# Altium footprint library ref-packages.PCBLIB: 1543 footprints (part 12 of 103)
Each footprint in its own frame and in the unit in brackets; x right, y up, seen from the top. Pads: shape width x height; smd on the part's side, far side on the other; paste and mask are expansions set on the pad; w line width, h text height; cw(c..) or ccw(c..) is an arc to the next point about the centre after c.
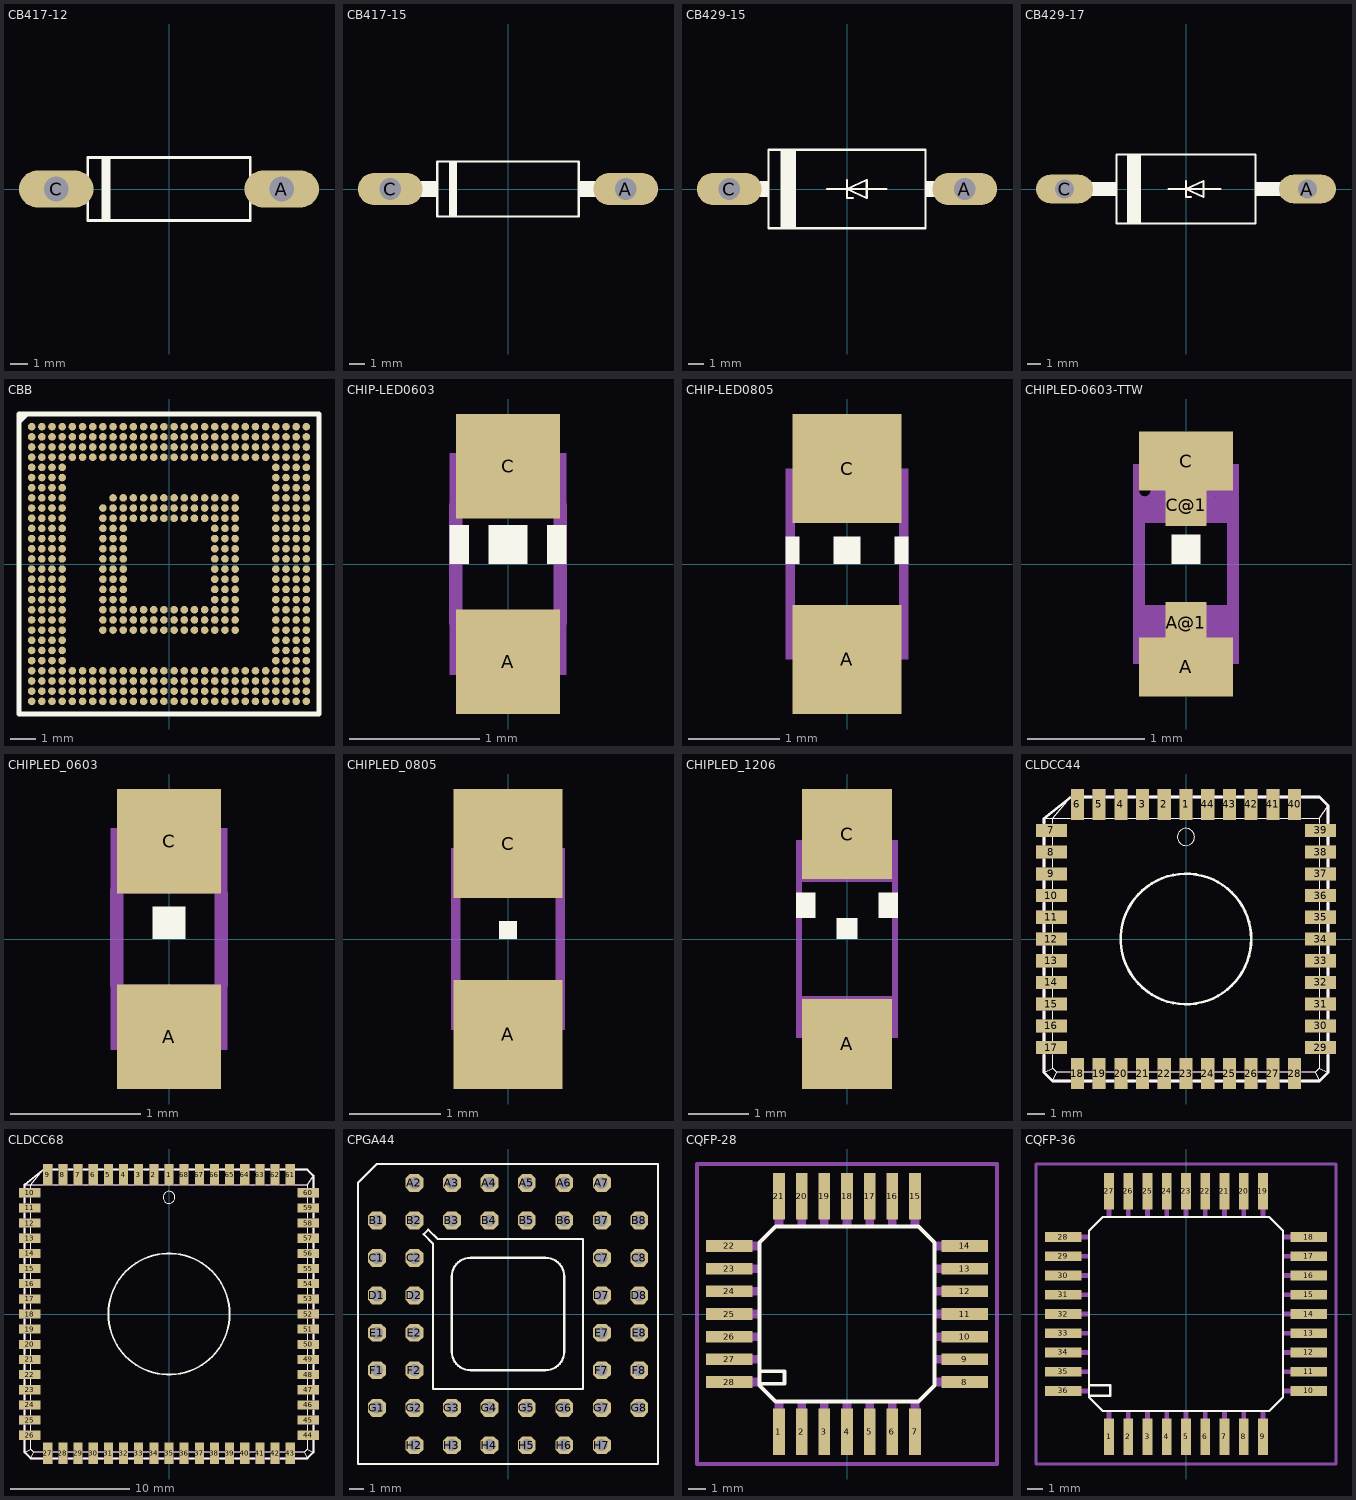
[diagram p11: the footprints below, top view; thin cyan lines are the x and y axes]

## CB417-12 [mil]
pads (2):
  oval 165x82.5 hole 55: A(250,0) C(-250,0)
Top Overlay:
  rectangle: -150,-70 -130,70
  rectangle: 180,-21 195,21
  rectangle: -195,-21 -180,21
  lines w6: -180,-70 -180,70 180,70 180,-70 -180,-70
Mechanical 16:
  lines w44: -250,0 -200,0 ; 200,0 250,0

## CB417-15 [mil]
pads (2):
  oval 165x82.5 hole 55: A(300,0) C(-300,0)
Top Overlay:
  rectangle: -150,-70 -130,70
  rectangle: 180,-21 245,21
  rectangle: -245,-21 -180,21
  lines w6: -180,-70 -180,70 180,70 180,-70 -180,-70
Mechanical 16:
  lines w44: -300,0 -250,0 ; 250,0 300,0

## CB429-15 [mil]
pads (2):
  oval 165x82.5 hole 55: A(300,0) C(-300,0)
Top Overlay:
  rectangle: -170,-100 -130,100
  rectangle: -235,-20 -200,20
  rectangle: 200,-20 235,20
  lines w6: -50,0 0,0 ; 0,23 0,0 ; 15,-23 0,-23 0,0 ; 100,0 0,0 ; 0,0 50,23 50,-23 0,0 ; -200,-100 -200,100 200,100 200,-100 -200,-100
Mechanical 16:
  lines w40: -300,0 -240,0 ; 240,0 300,0

## CB429-17 [mil]
pads (2):
  oval 165x82.5 hole 55: A(350,0) C(-350,0)
Top Overlay:
  rectangle: -170,-100 -130,100
  rectangle: 200,-20 285,20
  rectangle: -285,-20 -200,20
  lines w6: -50,0 0,0 ; 0,23 0,0 ; 15,-23 0,-23 0,0 ; 100,0 0,0 ; 0,0 50,23 50,-23 0,0 ; -200,-100 -200,100 200,100 200,-100 -200,-100
Mechanical 16:
  lines w40: -350,0 -290,0 ; 290,0 350,0

## CBB [mm]
pads (515):
  rrect100% 0.3x0.3 smd: A1(-5.4,5.4) A2(-5,5.4) A3(-4.6,5.4) A4(-4.2,5.4) A5(-3.8,5.4) A6(-3.4,5.4) A7(-3,5.4) A8(-2.6,5.4) A9(-2.2,5.4) A10(-1.8,5.4) A11(-1.4,5.4) A12(-1,5.4) A13(-0.6,5.4) A14(-0.2,5.4) A15(0.2,5.4) A16(0.6,5.4) A17(1,5.4) A18(1.4,5.4) A19(1.8,5.4) A20(2.2,5.4) A21(2.6,5.4) A22(3,5.4) A23(3.4,5.4) A24(3.8,5.4) A25(4.2,5.4) A26(4.6,5.4) A27(5,5.4) A28(5.4,5.4) AA1(-5.4,-2.6) AA2(-5,-2.6) AA3(-4.6,-2.6) AA4(-4.2,-2.6) AA8(-2.6,-2.6) AA9(-2.2,-2.6) AA10(-1.8,-2.6) AA11(-1.4,-2.6) AA12(-1,-2.6) AA13(-0.6,-2.6) AA14(-0.2,-2.6) AA15(0.2,-2.6) AA16(0.6,-2.6) AA17(1,-2.6) AA18(1.4,-2.6) AA19(1.8,-2.6) AA20(2.2,-2.6) AA21(2.6,-2.6) AA25(4.2,-2.6) AA26(4.6,-2.6) AA27(5,-2.6) AA28(5.4,-2.6) AB1(-5.4,-3) AB2(-5,-3) AB3(-4.6,-3) AB4(-4.2,-3) AB25(4.2,-3) AB26(4.6,-3) AB27(5,-3) AB28(5.4,-3) AC1(-5.4,-3.4) AC2(-5,-3.4) AC3(-4.6,-3.4) AC4(-4.2,-3.4) AC25(4.2,-3.4) AC26(4.6,-3.4) AC27(5,-3.4) AC28(5.4,-3.4) AD1(-5.4,-3.8) AD2(-5,-3.8) AD3(-4.6,-3.8) AD4(-4.2,-3.8) AD25(4.2,-3.8) AD26(4.6,-3.8) AD27(5,-3.8) AD28(5.4,-3.8) AE1(-5.4,-4.2) AE2(-5,-4.2) AE3(-4.6,-4.2) AE4(-4.2,-4.2) AE5(-3.8,-4.2) AE6(-3.4,-4.2) AE7(-3,-4.2) AE8(-2.6,-4.2) AE9(-2.2,-4.2) AE10(-1.8,-4.2) AE11(-1.4,-4.2) AE12(-1,-4.2) AE13(-0.6,-4.2) AE14(-0.2,-4.2) AE15(0.2,-4.2) AE16(0.6,-4.2) AE17(1,-4.2) AE18(1.4,-4.2) AE19(1.8,-4.2) AE20(2.2,-4.2) AE21(2.6,-4.2) AE22(3,-4.2) AE23(3.4,-4.2) AE24(3.8,-4.2) AE25(4.2,-4.2) AE26(4.6,-4.2) AE27(5,-4.2) AE28(5.4,-4.2) AF1(-5.4,-4.6) AF2(-5,-4.6) AF3(-4.6,-4.6) AF4(-4.2,-4.6) AF5(-3.8,-4.6) AF6(-3.4,-4.6) AF7(-3,-4.6) AF8(-2.6,-4.6) AF9(-2.2,-4.6) AF10(-1.8,-4.6) AF11(-1.4,-4.6) AF12(-1,-4.6) AF13(-0.6,-4.6) AF14(-0.2,-4.6) AF15(0.2,-4.6) AF16(0.6,-4.6) AF17(1,-4.6) AF18(1.4,-4.6) AF19(1.8,-4.6) AF20(2.2,-4.6) AF21(2.6,-4.6) AF22(3,-4.6) AF23(3.4,-4.6) AF24(3.8,-4.6) AF25(4.2,-4.6) AF26(4.6,-4.6) AF27(5,-4.6) AF28(5.4,-4.6) AG1(-5.4,-5) AG2(-5,-5) AG3(-4.6,-5) AG4(-4.2,-5) AG5(-3.8,-5) AG6(-3.4,-5) AG7(-3,-5) AG8(-2.6,-5) AG9(-2.2,-5) AG10(-1.8,-5) AG11(-1.4,-5) AG12(-1,-5) AG13(-0.6,-5) AG14(-0.2,-5) AG15(0.2,-5) AG16(0.6,-5) AG17(1,-5) AG18(1.4,-5) AG19(1.8,-5) AG20(2.2,-5) AG21(2.6,-5) AG22(3,-5) AG23(3.4,-5) AG24(3.8,-5) AG25(4.2,-5) AG26(4.6,-5) AG27(5,-5) AG28(5.4,-5) AH1(-5.4,-5.4) AH2(-5,-5.4) AH3(-4.6,-5.4) AH4(-4.2,-5.4) AH5(-3.8,-5.4) AH6(-3.4,-5.4) AH7(-3,-5.4) AH8(-2.6,-5.4) AH9(-2.2,-5.4) AH10(-1.8,-5.4) AH11(-1.4,-5.4) AH12(-1,-5.4) AH13(-0.6,-5.4) AH14(-0.2,-5.4) AH15(0.2,-5.4) AH16(0.6,-5.4) AH17(1,-5.4) AH18(1.4,-5.4) AH19(1.8,-5.4) AH20(2.2,-5.4) AH21(2.6,-5.4) AH22(3,-5.4) AH23(3.4,-5.4) AH24(3.8,-5.4) AH25(4.2,-5.4) AH26(4.6,-5.4) AH27(5,-5.4) AH28(5.4,-5.4) B1(-5.4,5) B2(-5,5) B3(-4.6,5) B4(-4.2,5) B5(-3.8,5) B6(-3.4,5) B7(-3,5) B8(-2.6,5) B9(-2.2,5) B10(-1.8,5) B11(-1.4,5) B12(-1,5) B13(-0.6,5) B14(-0.2,5) B15(0.2,5) B16(0.6,5) B17(1,5) B18(1.4,5) B19(1.8,5) B20(2.2,5) B21(2.6,5) B22(3,5) B23(3.4,5) B24(3.8,5) B25(4.2,5) B26(4.6,5) B27(5,5) B28(5.4,5) C1(-5.4,4.6) C2(-5,4.6) C3(-4.6,4.6) C4(-4.2,4.6) C5(-3.8,4.6) C6(-3.4,4.6) C7(-3,4.6) C8(-2.6,4.6) C9(-2.2,4.6) C10(-1.8,4.6) C11(-1.4,4.6) C12(-1,4.6) C13(-0.6,4.6) C14(-0.2,4.6) C15(0.2,4.6) C16(0.6,4.6) C17(1,4.6) C18(1.4,4.6) C19(1.8,4.6) C20(2.2,4.6) C21(2.6,4.6) C22(3,4.6) C23(3.4,4.6) C24(3.8,4.6) C25(4.2,4.6) C26(4.6,4.6) C27(5,4.6) C28(5.4,4.6) D1(-5.4,4.2) D2(-5,4.2) D3(-4.6,4.2) D4(-4.2,4.2) D5(-3.8,4.2) D6(-3.4,4.2) D7(-3,4.2) D8(-2.6,4.2) D9(-2.2,4.2) D10(-1.8,4.2) D11(-1.4,4.2) D12(-1,4.2) D13(-0.6,4.2) D14(-0.2,4.2) D15(0.2,4.2) D16(0.6,4.2) D17(1,4.2) D18(1.4,4.2) D19(1.8,4.2) D20(2.2,4.2) D21(2.6,4.2) D22(3,4.2) D23(3.4,4.2) D24(3.8,4.2) D25(4.2,4.2) D26(4.6,4.2) D27(5,4.2) D28(5.4,4.2) E1(-5.4,3.8) E2(-5,3.8) E3(-4.6,3.8) E4(-4.2,3.8) E25(4.2,3.8) E26(4.6,3.8) E27(5,3.8) E28(5.4,3.8) F1(-5.4,3.4) F2(-5,3.4) F3(-4.6,3.4) F4(-4.2,3.4) F25(4.2,3.4) F26(4.6,3.4) F27(5,3.4) F28(5.4,3.4) G1(-5.4,3) G2(-5,3) G3(-4.6,3) G4(-4.2,3) G25(4.2,3) G26(4.6,3) G27(5,3) G28(5.4,3) H1(-5.4,2.6) H2(-5,2.6) H3(-4.6,2.6) H4(-4.2,2.6) H9(-2.2,2.6) H10(-1.8,2.6) H11(-1.4,2.6) H12(-1,2.6) H13(-0.6,2.6) H14(-0.2,2.6) H15(0.2,2.6) H16(0.6,2.6) H17(1,2.6) H18(1.4,2.6) H19(1.8,2.6) H20(2.2,2.6) H21(2.6,2.6) H25(4.2,2.6) H26(4.6,2.6) H27(5,2.6) H28(5.4,2.6) J1(-5.4,2.2) J2(-5,2.2) J3(-4.6,2.2) J4(-4.2,2.2) J8(-2.6,2.2) J9(-2.2,2.2) J10(-1.8,2.2) J11(-1.4,2.2) J12(-1,2.2) J13(-0.6,2.2) J14(-0.2,2.2) J15(0.2,2.2) J16(0.6,2.2) J17(1,2.2) J18(1.4,2.2) J19(1.8,2.2) J20(2.2,2.2) J21(2.6,2.2) J25(4.2,2.2) J26(4.6,2.2) J27(5,2.2) J28(5.4,2.2) K1(-5.4,1.8) K2(-5,1.8) K3(-4.6,1.8) K4(-4.2,1.8) K8(-2.6,1.8) K9(-2.2,1.8) K10(-1.8,1.8) K11(-1.4,1.8) K12(-1,1.8) K13(-0.6,1.8) K14(-0.2,1.8) K15(0.2,1.8) K16(0.6,1.8) K17(1,1.8) K18(1.4,1.8) K19(1.8,1.8) K20(2.2,1.8) K21(2.6,1.8) K25(4.2,1.8) K26(4.6,1.8) K27(5,1.8) K28(5.4,1.8) L1(-5.4,1.4) L2(-5,1.4) L3(-4.6,1.4) L4(-4.2,1.4) L8(-2.6,1.4) L9(-2.2,1.4) L10(-1.8,1.4) L19(1.8,1.4) L20(2.2,1.4) L21(2.6,1.4) L25(4.2,1.4) L26(4.6,1.4) L27(5,1.4) L28(5.4,1.4) M1(-5.4,1) M2(-5,1) M3(-4.6,1) M4(-4.2,1) M8(-2.6,1) M9(-2.2,1) M10(-1.8,1) M19(1.8,1) M20(2.2,1) M21(2.6,1) M25(4.2,1) M26(4.6,1) M27(5,1) M28(5.4,1) N1(-5.4,0.6) N2(-5,0.6) N3(-4.6,0.6) N4(-4.2,0.6) N8(-2.6,0.6) N9(-2.2,0.6) N10(-1.8,0.6) N19(1.8,0.6) N20(2.2,0.6) N21(2.6,0.6) N25(4.2,0.6) N26(4.6,0.6) N27(5,0.6) N28(5.4,0.6) P1(-5.4,0.2) P2(-5,0.2) P3(-4.6,0.2) P4(-4.2,0.2) P8(-2.6,0.2) P9(-2.2,0.2) P10(-1.8,0.2) P19(1.8,0.2) P20(2.2,0.2) P21(2.6,0.2) P25(4.2,0.2) P26(4.6,0.2) P27(5,0.2) P28(5.4,0.2) R1(-5.4,-0.2) R2(-5,-0.2) R3(-4.6,-0.2) R4(-4.2,-0.2) R8(-2.6,-0.2) R9(-2.2,-0.2) R10(-1.8,-0.2) R19(1.8,-0.2) R20(2.2,-0.2) R21(2.6,-0.2) R25(4.2,-0.2) R26(4.6,-0.2) R27(5,-0.2) R28(5.4,-0.2) T1(-5.4,-0.6) T2(-5,-0.6) T3(-4.6,-0.6) T4(-4.2,-0.6) T8(-2.6,-0.6) T9(-2.2,-0.6) T10(-1.8,-0.6) T19(1.8,-0.6) T20(2.2,-0.6) T21(2.6,-0.6) T25(4.2,-0.6) T26(4.6,-0.6) T27(5,-0.6) T28(5.4,-0.6) U1(-5.4,-1) U2(-5,-1) U3(-4.6,-1) U4(-4.2,-1) U8(-2.6,-1) U9(-2.2,-1) U10(-1.8,-1) U19(1.8,-1) U20(2.2,-1) U21(2.6,-1) U25(4.2,-1) U26(4.6,-1) U27(5,-1) U28(5.4,-1) V1(-5.4,-1.4) V2(-5,-1.4) V3(-4.6,-1.4) V4(-4.2,-1.4) V8(-2.6,-1.4) V9(-2.2,-1.4) V10(-1.8,-1.4) V19(1.8,-1.4) V20(2.2,-1.4) V21(2.6,-1.4) V25(4.2,-1.4) V26(4.6,-1.4) V27(5,-1.4) V28(5.4,-1.4) W1(-5.4,-1.8) W2(-5,-1.8) W3(-4.6,-1.8) W4(-4.2,-1.8) W8(-2.6,-1.8) W9(-2.2,-1.8) W10(-1.8,-1.8) W11(-1.4,-1.8) W12(-1,-1.8) W13(-0.6,-1.8) W14(-0.2,-1.8) W15(0.2,-1.8) W16(0.6,-1.8) W17(1,-1.8) W18(1.4,-1.8) W19(1.8,-1.8) W20(2.2,-1.8) W21(2.6,-1.8) W25(4.2,-1.8) W26(4.6,-1.8) W27(5,-1.8) W28(5.4,-1.8) Y1(-5.4,-2.2) Y2(-5,-2.2) Y3(-4.6,-2.2) Y4(-4.2,-2.2) Y8(-2.6,-2.2) Y9(-2.2,-2.2) Y10(-1.8,-2.2) Y11(-1.4,-2.2) Y12(-1,-2.2) Y13(-0.6,-2.2) Y14(-0.2,-2.2) Y15(0.2,-2.2) Y16(0.6,-2.2) Y17(1,-2.2) Y18(1.4,-2.2) Y19(1.8,-2.2) Y20(2.2,-2.2) Y21(2.6,-2.2) Y25(4.2,-2.2) Y26(4.6,-2.2) Y27(5,-2.2) Y28(5.4,-2.2)
Top Overlay:
  lines w0.203: -5.898,5.6 -5.898,5.898 -5.6,5.898 ; -5.898,5.6 -5.898,-5.898 5.898,-5.898 5.898,5.898 -5.6,5.898 ; -5.898,5.6 -5.6,5.898
Top Solder:
  drawing of 515 lines, arcs and shapes, not listed

## CHIP-LED0603 [mil]
pads (2):
  rect 31.5x31.5 smd: A(0,-29.53) C(0,29.53)
Top Overlay:
  rectangle: -17.72,0 -11.81,11.81
  rectangle: 11.81,0 17.72,11.81
  rectangle: -5.91,0 5.91,11.81
Mechanical 16:
  rectangle: -17.72,17.72 17.72,33.46
  rectangle: -17.72,-33.46 17.72,-17.72
  lines w4: -15.75,-17.72 -15.75,17.72 ; 15.75,-17.72 15.75,17.72

## CHIP-LED0805 [mil]
pads (2):
  rect 47.24x47.24 smd: A(0,-41.34) C(0,41.34)
Top Overlay:
  rectangle: -26.57,0 -20.67,11.81
  rectangle: 20.67,0 26.57,11.81
  rectangle: -5.91,0 5.91,11.81
Mechanical 16:
  rectangle: -26.57,17.72 26.57,41.34
  rectangle: -26.57,-41.34 26.57,-17.72
  lines w4: -24.61,-17.72 -24.61,17.72 ; 24.61,-18.7 24.61,17.72

## CHIPLED-0603-TTW [mm]
pads (4):
  rect 0.8x0.5 smd: A(0,-0.875) C(0,0.875)
  rect 0.35x0.35 smd: A@1(0,-0.5) C@1(0,0.5)
Top Overlay:
  rectangle: -0.125,0 0.125,0.25
Top Solder:
  rectangle: -0.175,0.325 0.175,0.7
  rectangle: -0.4,0.625 0.4,1.125
  rectangle: -0.4,-1.125 0.4,-0.625
  rectangle: -0.175,-0.675 0.175,-0.325
Mechanical 16:
  circle w0.051: c-0.35,0.625 r0.075
  rectangle: -0.45,0.7 -0.25,0.85
  rectangle: -0.275,0.55 -0.225,0.6
  rectangle: -0.45,0.35 -0.4,0.725
  rectangle: 0.25,0.55 0.45,0.85
  rectangle: -0.45,0.35 0.45,0.575
  rectangle: -0.45,-0.85 -0.25,-0.35
  rectangle: 0.25,-0.85 0.45,-0.35
  rectangle: -0.275,-0.575 0.275,-0.35
  rectangle: -0.275,-0.65 -0.175,-0.55
  rectangle: 0.175,-0.65 0.275,-0.55
  lines w0.051: -0.275,-0.825 cw(c0,-0.825) 0.275,-0.825
  lines w0.102: -0.4,-0.35 -0.4,0.375 ; -0.3,0.8 ccw(c0,0.826) 0.3,0.8 ; 0.4,-0.35 0.4,0.35

## CHIPLED_0603 [mil]
pads (2):
  rect 31.5x31.5 smd: A(0,-29.53) C(0,29.53)
Top Overlay:
  rectangle: -4.92,0 4.92,9.84
Mechanical 16:
  circle w2: c-13.78,24.61 r2.95
  rectangle: -17.72,27.56 -9.84,33.46
  rectangle: -10.83,21.65 -8.86,23.62
  rectangle: -17.72,13.78 -15.75,28.54
  rectangle: 9.84,21.65 17.72,33.46
  rectangle: -17.72,13.78 17.72,22.64
  rectangle: -17.72,-33.46 -9.84,-13.78
  rectangle: 9.84,-33.46 17.72,-13.78
  rectangle: -10.83,-22.64 10.83,-13.78
  rectangle: -10.83,-25.59 -6.89,-21.65
  rectangle: 6.89,-25.59 10.83,-21.65
  lines w2: -10.83,-32.48 cw(c0,-32.48) 10.83,-32.48
  lines w4: -15.75,-13.78 -15.75,14.76 ; -11.81,31.5 ccw(c0,32.53) 11.81,31.5 ; 15.75,-13.78 15.75,13.78

## CHIPLED_0805 [mil]
pads (2):
  rect 47.24x47.24 smd: A(0,-41.34) C(0,41.34)
Top Overlay:
  rectangle: -3.94,0 3.94,7.87
Mechanical 16:
  circle w4: c-17.72,33.46 r4.06
  rectangle: 11.81,19.69 24.61,39.37
  rectangle: -12.8,19.69 -6.89,29.53
  rectangle: 6.89,19.69 12.8,29.53
  rectangle: -7.87,19.69 7.87,26.57
  rectangle: 11.81,-39.37 24.61,-19.69
  rectangle: -24.61,-39.37 -11.81,-19.69
  rectangle: 6.89,-29.53 12.8,-19.69
  rectangle: -12.8,-29.53 -6.89,-19.69
  rectangle: -7.87,-26.57 7.87,-19.69
  rectangle: -23.62,19.69 -11.81,31.5
  rectangle: -24.61,36.42 -13.78,39.37
  lines w4: -22.64,-19.69 -22.64,36.42 ; -13.78,-37.4 cw(c0,-38.42) 13.78,-37.4 ; -13.78,37.4 ccw(c0,38.42) 13.78,37.4 ; 22.64,-20.67 22.64,20.67

## CHIPLED_1206 [mil]
pads (2):
  rect 59.06x59.06 smd: A(0,-68.9) C(0,68.9)
Top Overlay:
  rectangle: -33.46,13.78 -20.67,30.51
  rectangle: 20.67,13.78 33.46,30.51
  rectangle: -6.89,0 6.89,13.78
Mechanical 16:
  circle w4: c-21.65,56.1 r3.94
  rectangle: -33.46,60.04 -13.78,64.96
  rectangle: -33.46,48.23 -24.61,61.02
  rectangle: -17.72,48.23 -12.8,57.09
  rectangle: -25.59,48.23 -8.86,53.15
  rectangle: 13.78,51.18 33.46,64.96
  rectangle: 9.84,48.23 33.46,53.15
  rectangle: -33.46,37.4 33.46,49.21
  rectangle: -33.46,-64.96 33.46,-37.4
  lines w4: -31.5,-37.4 -31.5,37.4 ; -15.75,62.99 ccw(c0,64.01) 15.75,62.99 ; 31.5,-37.4 31.5,37.4

## CLDCC44 [mil]
pads (44):
  rect 29.92x70.87 smd: 1(0,309.45) 2(-50,309.45) 3(-100,309.45) 4(-150,309.45) 5(-200,309.45) 6(-250,309.45) 18(-250,-309.45) 19(-200,-309.45) 20(-150,-309.45) 21(-100,-309.45) 22(-50,-309.45) 23(0,-309.45) 24(50,-309.45) 25(100,-309.45) 26(150,-309.45) 27(200,-309.45) 28(250,-309.45) 40(250,309.45) 41(200,309.45) 42(150,309.45) 43(100,309.45) 44(50,309.45)
  rect 70.87x29.92 smd: 7(-309.45,250) 8(-309.45,200) 9(-309.45,150) 10(-309.45,100) 11(-309.45,50) 12(-309.45,0) 13(-309.45,-50) 14(-309.45,-100) 15(-309.45,-150) 16(-309.45,-200) 17(-309.45,-250) 29(309.45,-250) 30(309.45,-200) 31(309.45,-150) 32(309.45,-100) 33(309.45,-50) 34(309.45,0) 35(309.45,50) 36(309.45,100) 37(309.45,150) 38(309.45,200) 39(309.45,250)
Top Overlay:
  circle w2: c0,234.65 r19.69
  circle w6: c0,0 r150
  lines w2: -326.38,-306.69 -306.69,-296.85 ; -326.38,277.17 -306.69,277.17 ; -306.69,-326.38 -296.85,-306.69 ; -306.69,-265.75 -306.69,-296.85 ; -306.69,-234.25 -306.69,-215.75 ; -306.69,-184.25 -306.69,-165.75 ; -306.69,-134.25 -306.69,-115.75 ; -306.69,-84.25 -306.69,-65.75 ; -306.69,-34.25 -306.69,-15.75 ; -306.69,15.75 -306.69,34.25 ; -306.69,65.75 -306.69,84.25 ; -306.69,115.75 -306.69,134.25 ; -306.69,165.75 -306.69,184.25 ; -306.69,215.75 -306.69,234.25 ; -306.69,265.75 -306.69,277.17 ; -265.75,-306.69 -296.85,-306.69 ; -265.75,277.17 -306.69,277.17 ; -265.75,325.59 -306.69,277.17 ; -234.25,-306.69 -215.75,-306.69 ; -234.25,277.17 -215.75,277.17 ; -184.25,-306.69 -165.75,-306.69 ; -184.25,277.17 -165.75,277.17 ; -134.25,-306.69 -115.75,-306.69 ; -134.25,277.17 -115.75,277.17 ; -84.25,-306.69 -65.75,-306.69 ; -84.25,277.17 -65.75,277.17 ; -34.25,-306.69 -15.75,-306.69 ; -34.25,277.17 -15.75,277.17 ; 15.75,-306.69 34.25,-306.69 ; 15.75,277.17 34.25,277.17 ; 65.75,-306.69 84.25,-306.69 ; 65.75,277.17 84.25,277.17 ; 115.75,-306.69 134.25,-306.69 ; 115.75,277.17 134.25,277.17 ; 165.75,-306.69 184.25,-306.69 ; 165.75,277.17 184.25,277.17 ; 215.75,-306.69 234.25,-306.69 ; 215.75,277.17 234.25,277.17 ; 265.75,-306.69 296.85,-306.69 ; 265.75,277.17 306.69,277.17 ; 306.69,-326.38 296.85,-306.69 ; 306.69,-265.75 306.69,-296.85 ; 306.69,-234.25 306.69,-215.75 ; 306.69,-184.25 306.69,-165.75 ; 306.69,-134.25 306.69,-115.75 ; 306.69,-84.25 306.69,-65.75 ; 306.69,-34.25 306.69,-15.75 ; 306.69,15.75 306.69,34.25 ; 306.69,65.75 306.69,84.25 ; 306.69,115.75 306.69,134.25 ; 306.69,165.75 306.69,184.25 ; 306.69,215.75 306.69,234.25 ; 306.69,265.75 306.69,277.17 ; 326.38,-306.69 306.69,-296.85 ; 326.38,306.69 306.69,277.17 ; -306.69,-296.85 -296.85,-306.69 ; 296.85,-306.69 306.69,-296.85
  lines w6: -326.38,-267.32 -326.38,-306.69 -306.69,-326.38 -267.32,-326.38 ; -326.38,-232.68 -326.38,-217.32 ; -326.38,-182.68 -326.38,-167.32 ; -326.38,-132.68 -326.38,-117.32 ; -326.38,-82.68 -326.38,-67.32 ; -326.38,-32.68 -326.38,-17.32 ; -326.38,17.32 -326.38,32.68 ; -326.38,67.32 -326.38,82.68 ; -326.38,117.32 -326.38,132.68 ; -326.38,167.32 -326.38,182.68 ; -326.38,217.32 -326.38,232.68 ; -326.38,267.32 -326.38,277.17 -267.32,324.41 ; -232.68,-326.38 -217.32,-326.38 ; -232.68,326.38 -217.32,326.38 ; -182.68,-326.38 -167.32,-326.38 ; -182.68,326.38 -167.32,326.38 ; -132.68,-326.38 -117.32,-326.38 ; -132.68,326.38 -117.32,326.38 ; -82.68,-326.38 -67.32,-326.38 ; -82.68,326.38 -67.32,326.38 ; -32.68,-326.38 -17.32,-326.38 ; -32.68,326.38 -17.32,326.38 ; 17.32,-326.38 32.68,-326.38 ; 17.32,326.38 32.68,326.38 ; 67.32,-326.38 82.68,-326.38 ; 67.32,326.38 82.68,326.38 ; 117.32,-326.38 132.68,-326.38 ; 117.32,326.38 132.68,326.38 ; 167.32,-326.38 182.68,-326.38 ; 167.32,326.38 182.68,326.38 ; 217.32,-326.38 232.68,-326.38 ; 217.32,326.38 232.68,326.38 ; 267.32,-326.38 306.69,-326.38 326.38,-306.69 326.38,-267.32 ; 267.32,326.38 306.69,326.38 326.38,306.69 326.38,267.32 ; 326.38,-232.68 326.38,-217.32 ; 326.38,-182.68 326.38,-167.32 ; 326.38,-132.68 326.38,-117.32 ; 326.38,-82.68 326.38,-67.32 ; 326.38,-32.68 326.38,-17.32 ; 326.38,17.32 326.38,32.68 ; 326.38,67.32 326.38,82.68 ; 326.38,117.32 326.38,132.68 ; 326.38,167.32 326.38,182.68 ; 326.38,217.32 326.38,232.68
Mechanical 16:
  rectangle: 326.38,85.04 344.88,114.96
  rectangle: 326.38,35.04 344.88,64.96
  rectangle: 326.38,-14.96 344.88,14.96
  rectangle: 326.38,-64.96 344.88,-35.04
  rectangle: 326.38,-114.96 344.88,-85.04
  rectangle: 326.38,-164.96 344.88,-135.04
  rectangle: 326.38,-214.96 344.88,-185.04
  rectangle: 135.04,-344.88 164.96,-326.38
  rectangle: 85.04,-344.88 114.96,-326.38
  rectangle: 35.04,-344.88 64.96,-326.38
  rectangle: -14.96,-344.88 14.96,-326.38
  rectangle: -64.96,-344.88 -35.04,-326.38
  rectangle: -114.96,-344.88 -85.04,-326.38
  rectangle: -264.96,-344.88 -235.04,-326.38
  rectangle: -344.88,185.04 -326.38,214.96
  rectangle: -344.88,135.04 -326.38,164.96
  rectangle: -344.88,85.04 -326.38,114.96
  rectangle: -344.88,35.04 -326.38,64.96
  rectangle: -344.88,-14.96 -326.38,14.96
  rectangle: -344.88,-64.96 -326.38,-35.04
  rectangle: -344.88,-114.96 -326.38,-85.04
  rectangle: 135.04,326.38 164.96,344.88
  rectangle: 85.04,326.38 114.96,344.88
  rectangle: 35.04,326.38 64.96,344.88
  rectangle: -14.96,326.38 14.96,344.88
  rectangle: -64.96,326.38 -35.04,344.88
  rectangle: -114.96,326.38 -85.04,344.88
  rectangle: -264.96,326.38 -235.04,344.88
  rectangle: 326.38,135.04 344.88,164.96
  rectangle: 326.38,185.04 344.88,214.96
  rectangle: -344.88,-164.96 -326.38,-135.04
  rectangle: -344.88,-214.96 -326.38,-185.04
  rectangle: 185.04,326.38 214.96,344.88
  rectangle: 235.04,326.38 264.96,344.88
  rectangle: -164.96,326.38 -135.04,344.88
  rectangle: -214.96,326.38 -185.04,344.88
  rectangle: -344.88,-264.96 -326.38,-235.04
  rectangle: -214.96,-344.88 -185.04,-326.38
  rectangle: -164.96,-344.88 -135.04,-326.38
  rectangle: 185.04,-344.88 214.96,-326.38
  rectangle: 235.04,-344.88 264.96,-326.38
  rectangle: 326.38,-264.96 344.88,-235.04
  rectangle: 326.38,235.04 344.88,264.96
  rectangle: -344.88,235.04 -326.38,264.96
  lines w2: -326.38,-306.69 -306.69,-296.85 ; -326.38,277.17 -306.69,277.17 ; -306.69,-326.38 -296.85,-306.69 ; -264.96,326.38 -306.69,277.17 ; 306.69,-326.38 296.85,-306.69 ; 326.38,-306.69 306.69,-296.85 ; 326.38,306.69 306.69,277.17 ; -306.69,-296.85 -296.85,-306.69 ; -306.69,-296.85 -306.69,277.17 ; -306.69,277.17 306.69,277.17 ; -296.85,-306.69 296.85,-306.69 ; 296.85,-306.69 306.69,-296.85 ; 306.69,-296.85 306.69,277.17
  lines w6: -326.38,-306.69 -306.69,-326.38 306.69,-326.38 326.38,-306.69 326.38,306.69 306.69,326.38 -264.96,326.38 -326.38,277.17 -326.38,-306.69

## CLDCC68 [mil]
pads (68):
  rect 29.92x70.87 smd: 1(0,459.45) 2(-50,459.45) 3(-100,459.45) 4(-150,459.45) 5(-200,459.45) 6(-250,459.45) 7(-300,459.45) 8(-350,459.45) 9(-400,459.45) 27(-400,-459.45) 28(-350,-459.45) 29(-300,-459.45) 30(-250,-459.45) 31(-200,-459.45) 32(-150,-459.45) 33(-100,-459.45) 34(-50,-459.45) 35(0,-459.45) 36(50,-459.45) 37(100,-459.45) 38(150,-459.45) 39(200,-459.45) 40(250,-459.45) 41(300,-459.45) 42(350,-459.45) 43(400,-459.45) 61(400,459.45) 62(350,459.45) 63(300,459.45) 64(250,459.45) 65(200,459.45) 66(150,459.45) 67(100,459.45) 68(50,459.45)
  rect 70.87x29.92 smd: 10(-459.45,400) 11(-459.45,350) 12(-459.45,300) 13(-459.45,250) 14(-459.45,200) 15(-459.45,150) 16(-459.45,100) 17(-459.45,50) 18(-459.45,0) 19(-459.45,-50) 20(-459.45,-100) 21(-459.45,-150) 22(-459.45,-200) 23(-459.45,-250) 24(-459.45,-300) 25(-459.45,-350) 26(-459.45,-400) 44(459.45,-400) 45(459.45,-350) 46(459.45,-300) 47(459.45,-250) 48(459.45,-200) 49(459.45,-150) 50(459.45,-100) 51(459.45,-50) 52(459.45,0) 53(459.45,50) 54(459.45,100) 55(459.45,150) 56(459.45,200) 57(459.45,250) 58(459.45,300) 59(459.45,350) 60(459.45,400)
Top Overlay:
  drawing of 158 lines, arcs and shapes, not listed
Mechanical 16:
  rectangle: 476.38,85.04 494.88,114.96
  rectangle: 476.38,35.04 494.88,64.96
  rectangle: 476.38,-14.96 494.88,14.96
  rectangle: 476.38,-64.96 494.88,-35.04
  rectangle: 476.38,-114.96 494.88,-85.04
  rectangle: 476.38,-164.96 494.88,-135.04
  rectangle: 476.38,-214.96 494.88,-185.04
  rectangle: 135.04,-494.88 164.96,-476.38
  rectangle: 85.04,-494.88 114.96,-476.38
  rectangle: 35.04,-494.88 64.96,-476.38
  rectangle: -14.96,-494.88 14.96,-476.38
  rectangle: -64.96,-494.88 -35.04,-476.38
  rectangle: -114.96,-494.88 -85.04,-476.38
  rectangle: -414.96,-494.88 -385.04,-476.38
  rectangle: -494.88,185.04 -476.38,214.96
  rectangle: -494.88,135.04 -476.38,164.96
  rectangle: -494.88,85.04 -476.38,114.96
  rectangle: -494.88,35.04 -476.38,64.96
  rectangle: -494.88,-14.96 -476.38,14.96
  rectangle: -494.88,-64.96 -476.38,-35.04
  rectangle: -494.88,-114.96 -476.38,-85.04
  rectangle: 135.04,476.38 164.96,494.88
  rectangle: 85.04,476.38 114.96,494.88
  rectangle: 35.04,476.38 64.96,494.88
  rectangle: -14.96,476.38 14.96,494.88
  rectangle: -64.96,476.38 -35.04,494.88
  rectangle: -114.96,476.38 -85.04,494.88
  rectangle: -414.96,476.38 -385.04,494.88
  rectangle: 476.38,135.04 494.88,164.96
  rectangle: 476.38,185.04 494.88,214.96
  rectangle: -494.88,-164.96 -476.38,-135.04
  rectangle: -494.88,-214.96 -476.38,-185.04
  rectangle: 185.04,476.38 214.96,494.88
  rectangle: 235.04,476.38 264.96,494.88
  rectangle: -164.96,476.38 -135.04,494.88
  rectangle: -214.96,476.38 -185.04,494.88
  rectangle: -494.88,-264.96 -476.38,-235.04
  rectangle: -214.96,-494.88 -185.04,-476.38
  rectangle: -164.96,-494.88 -135.04,-476.38
  rectangle: 185.04,-494.88 214.96,-476.38
  rectangle: 235.04,-494.88 264.96,-476.38
  rectangle: 476.38,-264.96 494.88,-235.04
  rectangle: 476.38,235.04 494.88,264.96
  rectangle: -494.88,235.04 -476.38,264.96
  rectangle: -264.96,-494.88 -235.04,-476.38
  rectangle: -314.96,-494.88 -285.04,-476.38
  rectangle: -364.96,-494.88 -335.04,-476.38
  rectangle: -494.88,-314.96 -476.38,-285.04
  rectangle: -494.88,-364.96 -476.38,-335.04
  rectangle: -494.88,-414.96 -476.38,-385.04
  rectangle: -494.88,285.04 -476.38,314.96
  rectangle: -494.88,335.04 -476.38,364.96
  rectangle: -494.88,385.04 -476.38,414.96
  rectangle: -264.96,476.38 -235.04,494.88
  rectangle: -314.96,476.38 -285.04,494.88
  rectangle: -364.96,476.38 -335.04,494.88
  rectangle: 476.38,285.04 494.88,314.96
  rectangle: 476.38,335.04 494.88,364.96
  rectangle: 476.38,385.04 494.88,414.96
  rectangle: 285.04,476.38 314.96,494.88
  rectangle: 335.04,476.38 364.96,494.88
  rectangle: 385.04,476.38 414.96,494.88
  rectangle: 476.38,-314.96 494.88,-285.04
  rectangle: 476.38,-364.96 494.88,-335.04
  rectangle: 476.38,-414.96 494.88,-385.04
  rectangle: 285.04,-494.88 314.96,-476.38
  rectangle: 335.04,-494.88 364.96,-476.38
  rectangle: 385.04,-494.88 414.96,-476.38
  lines w2: -476.38,-456.69 -456.69,-446.85 ; -476.38,427.17 -456.69,427.17 ; -456.69,-476.38 -446.85,-456.69 ; -414.96,476.38 -456.69,427.17 ; 456.69,-476.38 446.85,-456.69 ; 476.38,-456.69 456.69,-446.85 ; 476.38,456.69 456.69,427.17 ; -456.69,-446.85 -446.85,-456.69 ; -456.69,-446.85 -456.69,427.17 ; -456.69,427.17 456.69,427.17 ; -446.85,-456.69 446.85,-456.69 ; 446.85,-456.69 456.69,-446.85 ; 456.69,-446.85 456.69,427.17
  lines w6: -476.38,-456.69 -456.69,-476.38 456.69,-476.38 476.38,-456.69 476.38,456.69 456.69,476.38 -414.96,476.38 -476.38,427.17 -476.38,-456.69

## CPGA44 [mil]
pads (44):
  oct 48x48 hole 32: A2(-250,350) A3(-150,350) A4(-50,350) A5(50,350) A6(150,350) A7(250,350) B1(-350,250) B2(-250,250) B3(-150,250) B4(-50,250) B5(50,250) B6(150,250) B7(250,250) B8(350,250) C1(-350,150) C2(-250,150) C7(250,150) C8(350,150) D1(-350,50) D2(-250,50) D7(250,50) D8(350,50) E1(-350,-50) E2(-250,-50) E7(250,-50) E8(350,-50) F1(-350,-150) F2(-250,-150) F7(250,-150) F8(350,-150) G1(-350,-250) G2(-250,-250) G3(-150,-250) G4(-50,-250) G5(50,-250) G6(150,-250) G7(250,-250) G8(350,-250) H2(-250,-350) H3(-150,-350) H4(-50,-350) H5(50,-350) H6(150,-350) H7(250,-350)
Top Overlay:
  lines w6: -400,-400 -400,350 -350,400 400,400 400,-400 -400,-400 ; -225,212.5 -200,187.5 -200,-200 200,-200 200,200 -187.5,200 -212.5,225 -225,212.5 ; -150,-100 -150,100 cw(c-100,100) -100,150 100,150 cw(c100,100) 150,100 150,-100 cw(c100,-100) 100,-150 -100,-150 cw(c-100,-100) -150,-100

## CQFP-28 [mm]
pads (28):
  rect 0.65x2.6 smd: 1(-3.81,-6.6) 2(-2.54,-6.6) 3(-1.27,-6.6) 4(0,-6.6) 5(1.27,-6.6) 6(2.54,-6.6) 7(3.81,-6.6) 15(3.81,6.6) 16(2.54,6.6) 17(1.27,6.6) 18(0,6.6) 19(-1.27,6.6) 20(-2.54,6.6) 21(-3.81,6.6)
  rect 2.6x0.65 smd: 8(6.6,-3.81) 9(6.6,-2.54) 10(6.6,-1.27) 11(6.6,0) 12(6.6,1.27) 13(6.6,2.54) 14(6.6,3.81) 22(-6.6,3.81) 23(-6.6,2.54) 24(-6.6,1.27) 25(-6.6,0) 26(-6.6,-1.27) 27(-6.6,-2.54) 28(-6.6,-3.81)
Top Overlay:
  lines w0.203: -4.8,-3.2 -3.5,-3.2 -3.5,-3.9 -4.9,-3.9 ; -4.9,-3.9 -4.9,4 -4,4.9 4,4.9 4.9,4 4.9,-4 4,-4.9 -4,-4.9 -4.9,-4 -4.9,-3.9
Mechanical 16:
  rectangle: -4.05,-7.4 -3.57,-4.91
  rectangle: -2.78,-7.4 -2.3,-4.91
  rectangle: -1.51,-7.4 -1.03,-4.91
  rectangle: -0.24,-7.4 0.24,-4.91
  rectangle: 1.03,-7.4 1.51,-4.91
  rectangle: 2.3,-7.4 2.78,-4.91
  rectangle: 3.57,-7.4 4.05,-4.91
  rectangle: 4.91,-4.05 7.4,-3.57
  rectangle: 4.91,-2.78 7.4,-2.3
  rectangle: 4.91,-1.51 7.4,-1.03
  rectangle: 4.91,-0.24 7.4,0.24
  rectangle: 4.91,1.03 7.4,1.51
  rectangle: 4.91,2.3 7.4,2.78
  rectangle: 4.91,3.57 7.4,4.05
  rectangle: 3.57,4.91 4.05,7.4
  rectangle: 2.3,4.91 2.78,7.4
  rectangle: 1.03,4.91 1.51,7.4
  rectangle: -0.24,4.91 0.24,7.4
  rectangle: -1.51,4.91 -1.03,7.4
  rectangle: -2.78,4.91 -2.3,7.4
  rectangle: -4.05,4.91 -3.57,7.4
  rectangle: -7.4,3.57 -4.91,4.05
  rectangle: -7.4,2.3 -4.91,2.78
  rectangle: -7.4,1.03 -4.91,1.51
  rectangle: -7.4,-0.24 -4.91,0.24
  rectangle: -7.4,-1.51 -4.91,-1.03
  rectangle: -7.4,-2.78 -4.91,-2.3
  rectangle: -7.4,-4.05 -4.91,-3.57
Mechanical 27:
  lines w0.2: -8.403,-8.403 8.403,-8.403 8.403,8.403 -8.403,8.403 -8.403,-8.403

## CQFP-36 [mm]
pads (36):
  rect 0.65x2.4 smd: 1(-5.08,-8.1) 2(-3.81,-8.1) 3(-2.54,-8.1) 4(-1.27,-8.1) 5(0,-8.1) 6(1.27,-8.1) 7(2.54,-8.1) 8(3.81,-8.1) 9(5.08,-8.1) 19(5.08,8.1) 20(3.81,8.1) 21(2.54,8.1) 22(1.27,8.1) 23(0,8.1) 24(-1.27,8.1) 25(-2.54,8.1) 26(-3.81,8.1) 27(-5.08,8.1)
  rect 2.4x0.65 smd: 10(8.1,-5.08) 11(8.1,-3.81) 12(8.1,-2.54) 13(8.1,-1.27) 14(8.1,0) 15(8.1,1.27) 16(8.1,2.54) 17(8.1,3.81) 18(8.1,5.08) 28(-8.1,5.08) 29(-8.1,3.81) 30(-8.1,2.54) 31(-8.1,1.27) 32(-8.1,0) 33(-8.1,-1.27) 34(-8.1,-2.54) 35(-8.1,-3.81) 36(-8.1,-5.08)
Top Overlay:
  lines w0.152: -6.3,-4.7 -5,-4.7 -5,-5.4 -6.4,-5.4 ; -6.4,-5.4 -6.4,5.5 -5.5,6.4 5.5,6.4 6.4,5.5 6.4,-5.5 5.5,-6.4 -5.5,-6.4 -6.4,-5.5 -6.4,-5.4
Mechanical 16:
  rectangle: -5.24,-8.9 -4.92,-6.4
  rectangle: -3.97,-8.9 -3.65,-6.4
  rectangle: -2.7,-8.9 -2.38,-6.4
  rectangle: -1.43,-8.9 -1.11,-6.4
  rectangle: -0.16,-8.9 0.16,-6.4
  rectangle: 1.11,-8.9 1.43,-6.4
  rectangle: 2.38,-8.9 2.7,-6.4
  rectangle: 3.65,-8.9 3.97,-6.4
  rectangle: 4.92,-8.9 5.24,-6.4
  rectangle: 6.4,-5.24 8.9,-4.92
  rectangle: 6.4,-3.97 8.9,-3.65
  rectangle: 6.4,-2.7 8.9,-2.38
  rectangle: 6.4,-1.43 8.9,-1.11
  rectangle: 6.4,-0.16 8.9,0.16
  rectangle: 6.4,1.11 8.9,1.43
  rectangle: 6.4,2.38 8.9,2.7
  rectangle: 6.4,3.65 8.9,3.97
  rectangle: 6.4,4.92 8.9,5.24
  rectangle: 4.92,6.4 5.24,8.9
  rectangle: 3.65,6.4 3.97,8.9
  rectangle: 2.38,6.4 2.7,8.9
  rectangle: 1.11,6.4 1.43,8.9
  rectangle: -0.16,6.4 0.16,8.9
  rectangle: -1.43,6.4 -1.11,8.9
  rectangle: -2.7,6.4 -2.38,8.9
  rectangle: -3.97,6.4 -3.65,8.9
  rectangle: -5.24,6.4 -4.92,8.9
  rectangle: -8.9,4.92 -6.4,5.24
  rectangle: -8.9,3.65 -6.4,3.97
  rectangle: -8.9,2.38 -6.4,2.7
  rectangle: -8.9,1.11 -6.4,1.43
  rectangle: -8.9,-0.16 -6.4,0.16
  rectangle: -8.9,-1.43 -6.4,-1.11
  rectangle: -8.9,-2.7 -6.4,-2.38
  rectangle: -8.9,-3.97 -6.4,-3.65
  rectangle: -8.9,-5.24 -6.4,-4.92
Mechanical 27:
  lines w0.2: -9.903,-9.903 9.903,-9.903 9.903,9.903 -9.903,9.903 -9.903,-9.903